# Altium footprint library USRP2_Clone.PcbLib: 91 footprints (part 5 of 6)
Each footprint in its own frame and in the unit in brackets; x right, y up, seen from the top. Pads: shape width x height; smd on the part's side, far side on the other; paste and mask are expansions set on the pad; w line width, h text height; cw(c..) or ccw(c..) is an arc to the next point about the centre after c.
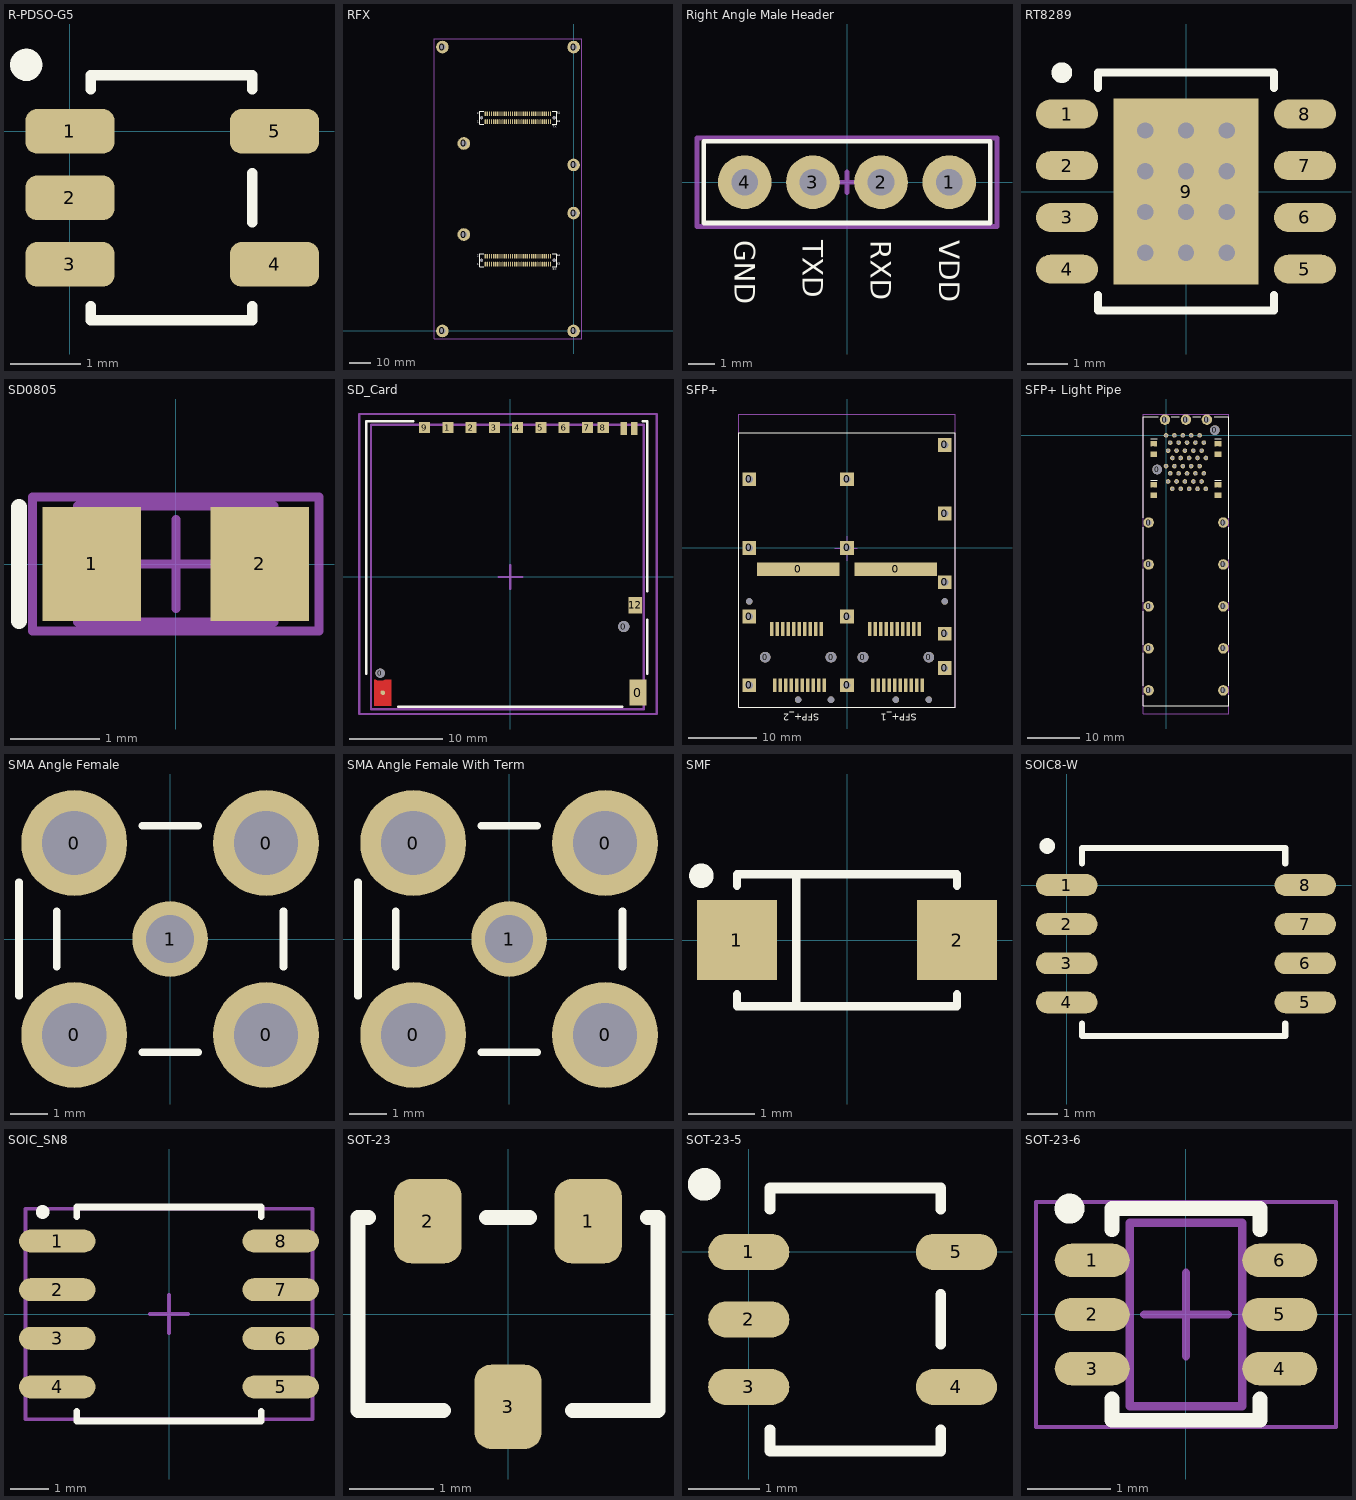
[diagram p4: the footprints below, top view; thin cyan lines are the x and y axes]

## R-PDSO-G5 [mm]
height 1.45
pads (5):
  rrect50% 1.27x0.635 smd: 1(0,0) 2(0,-0.95) 3(0,-1.9) 4(2.921,-1.9) 5(2.921,0)
Top Overlay:
  circle w0.254: c-0.625,0.95 r0.103
  lines w0.15: 0.3,-2.5 0.3,-2.7 2.6,-2.7 ; 0.3,0.6 0.3,0.8 2.6,0.8 2.6,0.6 ; 2.6,-2.5 2.6,-2.7 ; 2.6,-1.3 2.6,-0.6 ; 2.6,-2.7 2.6,-2.7
3D body "User Library-R-PDSO-G5.step": height 1.43, standoff -0.02, extent -0.075,-2.475 2.925,0.575

## RFX [mil]
height 393.7
pads (140):
  round 236.22 hole 118.11: 0(-2450,0) 0(-2450,5300) 0(-2050,1800) 0(-2050,3500) 0(0,0) 0(0,2200) 0(0,3100) 0(1,5299)
  round 59.06 hole 59.06 unplated: 0(-1717,1320) 0(-1717,3980) 0(-363,1320) 0(-363,3980)
  oval 24x92 smd: 1(-1650,3906) 2(-1650,4054) 3(-1611,3906) 4(-1611,4054) 5(-1572,3906) 6(-1572,4054) 7(-1532,3906) 8(-1532,4054) 9(-1493,3906) 10(-1493,4054) 11(-1454,3906) 12(-1454,4054) 13(-1414,3906) 14(-1414,4054) 15(-1375,3906) 16(-1375,4054) 17(-1336,3906) 18(-1336,4054) 19(-1296,3906) 20(-1296,4054) 21(-1257,3906) 22(-1257,4054) 23(-1217,3906) 24(-1217,4054) 25(-1178,3906) 26(-1178,4054) 27(-1139,3906) 28(-1139,4054) 29(-1099,3906) 30(-1099,4054) 31(-1060,3906) 32(-1060,4054) 33(-1021,3906) 34(-1021,4054) 35(-981,3906) 36(-981,4054) 37(-942,3906) 38(-942,4054) 39(-902,3906) 40(-902,4054) 41(-863,3906) 42(-863,4054) 43(-824,3906) 44(-824,4054) 45(-784,3906) 46(-784,4054) 47(-745,3906) 48(-745,4054) 49(-706,3906) 50(-706,4054) 51(-666,3906) 52(-666,4054) 53(-627,3906) 54(-627,4054) 55(-588,3906) 56(-588,4054) 57(-548,3906) 58(-548,4054) 59(-509,3906) 60(-509,4054) 61(-469,3906) 62(-469,4054) 63(-430,3906) 64(-430,4054) 65(-1650,1246) 66(-1650,1394) 67(-1611,1246) 68(-1611,1394) 69(-1572,1246) 70(-1572,1394) 71(-1532,1246) 72(-1532,1394) 73(-1493,1246) 74(-1493,1394) 75(-1454,1246) 76(-1454,1394) 77(-1414,1246) 78(-1414,1394) 79(-1375,1246) 80(-1375,1394) 81(-1336,1246) 82(-1336,1394) 83(-1296,1246) 84(-1296,1394) 85(-1257,1246) 86(-1257,1394) 87(-1217,1246) 88(-1217,1394) 89(-1178,1246) 90(-1178,1394) 91(-1139,1246) 92(-1139,1394) 93(-1099,1246) 94(-1099,1394) 95(-1060,1246) 96(-1060,1394) 97(-1021,1246) 98(-1021,1394) 99(-981,1246) 100(-981,1394) 101(-942,1246) 102(-942,1394) 103(-902,1246) 104(-902,1394) 105(-863,1246) 106(-863,1394) 107(-824,1246) 108(-824,1394) 109(-784,1246) 110(-784,1394) 111(-745,1246) 112(-745,1394) 113(-706,1246) 114(-706,1394) 115(-666,1246) 116(-666,1394) 117(-627,1246) 118(-627,1394) 119(-588,1246) 120(-588,1394) 121(-548,1246) 122(-548,1394) 123(-509,1246) 124(-509,1394) 125(-469,1246) 126(-469,1394) 127(-430,1246) 128(-430,1394)
Top Overlay:
  lines w7: -1677.63,1195 -1756.37,1195 -1756.37,1445 -1677.63,1445 ; -1677.63,3855 -1756.37,3855 -1756.37,4105 -1677.63,4105 ; -398.1,1195 -319.36,1195 -319.36,1445 -398.1,1445 ; -398.1,3855 -319.36,3855 -319.36,4105 -398.1,4105
  text "RX" at -390,1131 h40
  text "TX" at -390,3791 h40
  text "1" at -1799.36,1219.61 h40
  text "2" at -1799.36,1377.09 h40
  text "63" at -301.96,1228.46 h40
  text "64" at -301.96,1385.94 h40
  text "1" at -1800,3881 h40
  text "2" at -1800,4038.48 h40
  text "63" at -301.96,3888.46 h40
  text "64" at -301.96,4045.94 h40
Mechanical 13:
  lines w10: -2600,-150 150,-150 150,5450 -2600,5450 -2600,-150
3D body "714362164.stp": height 328.74, standoff -29.53, extent -1746.53,1199.92 -333.14,1440.08
3D body "714362164.stp": height 328.74, standoff -29.53, extent -1746.53,3859.92 -333.14,4100.08

## Right Angle Male Header [mm] "4-Way 2.54mm Right Angle Male Header"
height 3
pads (4):
  round 2 hole 1: 1(3.81,0) 2(1.27,0) 3(-1.27,0) 4(-3.81,0)
Top Overlay:
  lines w0.178: -5.334,-1.524 -5.334,1.524 5.334,1.524 5.334,-1.524 -5.334,-1.524
  text "GND" at -4.191,-2.159 h0.76
  text "TXD" at -1.651,-2.159 h0.76
  text "RXD" at 0.889,-2.159 h0.76
  text "VDD" at 3.429,-2.159 h0.76
Mechanical 15:
  lines w0.178: -0.508,0 0.508,0 ; 0,-0.381 0,0.381 ; -5.588,-1.651 -5.588,1.651 5.588,1.651 5.588,-1.651 -5.588,-1.651
3D body "User Library-Header_Male_RA_Low_4Pin.STEP": height 2.66, standoff -2.85, extent -5.08,-0.356 5.08,9.774

## RT8289 [mil]
height 39.37
pads (9):
  oval 60x28 smd: 1(-115,75) 2(-115,25) 3(-115,-25) 4(-115,-75) 5(115,-75) 6(115,-25) 7(115,25) 8(115,75)
  rect 140x180 all layers, no hole: 9(0,0)
via -39.37,59.06 diameter 27.56 hole 15.75
via 0,59.06 diameter 27.56 hole 15.75
via 39.37,59.06 diameter 27.56 hole 15.75
via -39.37,19.69 diameter 27.56 hole 15.75
via 0,19.69 diameter 27.56 hole 15.75
via 39.37,19.69 diameter 27.56 hole 15.75
via -39.37,-19.68 diameter 27.56 hole 15.75
via 0,-19.68 diameter 27.56 hole 15.75
via 39.37,-19.68 diameter 27.56 hole 15.75
via -39.37,-59.06 diameter 27.56 hole 15.75
via 0,-59.06 diameter 27.56 hole 15.75
via 39.37,-59.06 diameter 27.56 hole 15.75
Top Overlay:
  lines w7.87: -85,-100 -85,-115 85,-115 85,-100 ; -85,100 -85,115 85,115 85,100
  lines w10: -115.1,115.98 ccw(c-120,115) -115,115
Top Paste:
  rectangle: -62.99,3.94 -3.94,82.68
  rectangle: 3.94,3.94 62.99,82.68
  rectangle: -62.99,-82.68 -3.94,-3.94
  rectangle: 3.94,-82.68 62.99,-3.94
3D body "User Library-sop-8.step": height 62.99, standoff 0, extent -118.93,-98.82 118.94,98.82

## SD0805 [mm] "Schottky Barrier Rectifier Diode"
height 1.4
pads (2):
  rect 1.1x1.27 smd: 1(-0.94,0) 2(0.94,0)
Top Overlay:
  lines w0.178: -1.753,-0.635 -1.753,0.635
Mechanical 13:
  lines w0.1: -1.1,-0.65 1.1,-0.65 1.1,0.65 -1.1,0.65 -1.1,-0.65
Mechanical 15:
  lines w0.1: -0.5,0 0.5,0 ; 0,-0.5 0,0.5 ; -1.6,-0.75 1.6,-0.75 1.6,0.75 -1.6,0.75 -1.6,-0.75
3D body "User Library-D0805.step": height 0.76, standoff 0, extent -1.15,-0.675 1.15,0.675

## SD_Card [mm]
pads (16):
  round 1 hole 1 unplated: 0(-13.995,-10.338)
  round 0.5 smd: 0(-13.715,-12.438)
  round 1.2 hole 1.2 unplated: 0(12.192,-5.334)
  rect 1.8x2.8 smd: 0(13.712,-12.434)
  rect 1.2x1.2 smd: 1(-6.72,16.066) 2(-4.22,16.066) 3(-1.72,16.066) 4(0.78,16.066) 5(3.28,16.066) 6(5.78,16.066) 7(8.28,16.066) 8(9.98,16.066) 9(-9.22,16.066)
  rect 0.7x1.4 smd: 10(12.21,15.966) 11(13.31,15.966)
  rect 1.45x1.8 smd: 12(13.442,-3.034)
Top Layer:
  region: -14.61,-13.84 -14.61,-11.033 -14.463,-11.035 -14.355,-11.097 -14.119,-11.168 -13.871,-11.168 -13.635,-11.096 -13.527,-11.035 -12.811,-11.035 -12.808,-13.84
Top Overlay:
  lines w0.254: -15.494,-10.414 -15.494,16.764 -10.414,16.764 ; -12.065,-13.97 12.065,-13.97 ; 14.224,16.764 14.732,16.764 14.732,-1.524 ; 14.732,-10.414 14.732,-4.572
Mechanical 13:
  lines w0.254: -14.986,-14.224 -14.986,16.383 14.351,16.383 14.351,-14.224 -14.986,-14.224
Mechanical 15:
  lines w0.254: -1.27,0 1.27,0 ; 0,-1.27 0,1.27 ; -16.256,-14.732 -16.256,17.526 15.748,17.526 15.748,-14.732 -16.256,-14.732
3D body "User Library-sd card.step": height 2.35, standoff 0.25, extent -11.808,-19.755 12.192,12.245
3D body "c-1775059-1-d-3d.stp": height 2.83, standoff -0.58, extent -14.986,-14.233 14.324,16.367

## SFP+ [mm] "SFP+ 10Gbit Connector 1x2"
pads (65):
  rect 2x2 hole 1.05: 0(-14.25,-20) 0(-14.25,-10) 0(-14.25,0) 0(-14.25,10) 0(14.25,-5) 0(14.25,5) 0(14.25,15)
  round 0.95 hole 0.95 unplated: 0(-14.25,-7.8) 0(-7.13,-22.1) 0(-2.33,-22.1) 0(7.12,-22.1) 0(11.92,-22.1) 0(14.25,-7.8)
  round 1.55 hole 1.55 unplated: 0(-11.93,-15.9) 0(-2.33,-15.9) 0(2.33,-15.9) 0(11.93,-15.9)
  rect 12.05x2 smd: 0(-7.112,-3.1) 0(7.112,-3.1)
  rect 2x2 hole 0.95: 0(0,-20) 0(0,-10) 0(0,0) 0(0,10) 0(14.25,-17.5) 0(14.25,-12.5)
  rect 0.5x2 smd: 1(10.53,-11.8) 2(9.73,-11.8) 3(8.93,-11.8) 4(8.13,-11.8) 5(7.33,-11.8) 6(6.53,-11.8) 7(5.73,-11.8) 8(4.93,-11.8) 9(4.13,-11.8) 10(3.33,-11.8) 11(3.73,-20) 12(4.53,-20) 13(5.33,-20) 14(6.13,-20) 15(6.93,-20) 16(7.73,-20) 17(8.53,-20) 18(9.33,-20) 19(10.13,-20) 20(10.93,-20) 21(-3.73,-11.8) 22(-4.53,-11.8) 23(-5.33,-11.8) 24(-6.13,-11.8) 25(-6.93,-11.8) 26(-7.73,-11.8) 27(-8.53,-11.8) 28(-9.33,-11.8) 29(-10.13,-11.8) 30(-10.93,-11.8) 31(-10.53,-20) 32(-9.73,-20) 33(-8.93,-20) 34(-8.13,-20) 35(-7.33,-20) 36(-6.53,-20) 37(-5.73,-20) 38(-4.93,-20) 39(-4.13,-20) 40(-3.33,-20)
Top Overlay:
  lines w0.178: -15.748,-23.172 -15.748,16.764 15.748,16.764 15.748,-23.172 -15.748,-23.172
  text "SFP+_2" at -4.064,-24.188 h1.02
  text "SFP+_1" at 10.16,-24.188 h1.02
Mechanical 15:
  lines w0.178: -1.778,-0.058 1.524,-0.058 ; 0,-1.836 0,1.72 ; -15.748,-23.172 15.748,-23.172 15.748,19.5 -15.748,19.5 -15.748,-23.172
3D body "747540220.stp": height 10.67, standoff -2.91, extent -15.061,-22.539 15.088,26.487
3D body "744410010.stp": height 5.37, standoff -0.9, extent -12.612,-20.542 -1.612,-11.392
3D body "744410010.stp": height 5.37, standoff -0.9, extent 1.612,-20.542 12.612,-11.392

## SFP+ Light Pipe [mm] "CONN STACKED SFP+ 2X1 40POS"
height 26.25
pads (67):
  round 2 hole 1.05: 0(-3.325,-48.62) 0(-3.325,-40.62) 0(-3.325,-32.62) 0(-3.325,-24.62) 0(-3.325,-16.62) 0(-0.2,3.005) 0(3.8,3.005) 0(7.8,3.005) 0(10.925,-48.62) 0(10.925,-40.62) 0(10.925,-32.62) 0(10.925,-24.62) 0(10.925,-16.62)
  rrect50% 1.5x2.34 on Mech15: 0(-2.325,-10.45) 0(-2.325,-2.59) 0(9.925,-10.45) 0(9.925,-2.59)
  round 1.85 hole 1.85 unplated: 0(-1.7,-6.52) 0(9.3,0.98)
  rect 1.3x1.05 smd: INL_1(-2.325,-1.58) INL_2(-2.325,-3.6) INR_1(9.925,-1.58) INR_2(9.925,-3.6) OUTL_1(-2.325,-9.44) OUTL_2(-2.325,-11.46) OUTR_1(9.925,-9.44) OUTR_2(9.925,-11.46)
  round 0.88 hole 0.57: L1(7.2,-7.25) L2(6.4,-5.87) L3(5.6,-7.25) L4(4.8,-5.87) L5(4,-7.25) L6(3.2,-5.87) L7(2.4,-7.25) L8(1.6,-5.87) L9(0.8,-7.25) L10(0,-5.87) L11(0.4,-8.8) L12(1.2,-10.19) L13(2,-8.8) L14(2.8,-10.19) L15(3.6,-8.8) L16(4.4,-10.19) L17(5.2,-8.8) L18(6,-10.19) L19(6.8,-8.8) L20(7.6,-10.19) T1(0.4,-2.93) T2(1.2,-4.32) T3(2,-2.93) T4(2.8,-4.32) T5(3.6,-2.93) T6(4.4,-4.32) T7(5.2,-2.93) T8(6,-4.32) T9(6.8,-2.93) T10(7.6,-4.32) T11(7.2,-1.38) T12(6.4,0) T13(5.6,-1.38) T14(4.8,0) T15(4,-1.38) T16(3.2,0) T17(2.4,-1.38) T18(1.6,0) T19(0.8,-1.38) T20(0,0)
Top Overlay:
  lines w0.127: -2.96,-8.545 -1.69,-8.545 ; -2.96,-0.685 -1.69,-0.685 ; 9.29,-8.545 10.56,-8.545 ; 9.29,-0.685 10.56,-0.685
  lines w0.178: -4.318,-49.53 -4.318,-51.562 11.938,-51.562 11.938,-49.53 ; -4.318,-47.752 -4.318,-41.402 ; -4.318,-39.878 -4.318,-33.528 ; -4.318,-31.75 -4.318,-25.4 ; -4.318,-23.622 -4.318,-17.526 ; -4.318,-15.748 -4.318,3.556 -1.524,3.556 ; 1.016,3.556 2.54,3.556 ; 5.08,3.556 6.604,3.556 ; 9.144,3.556 11.938,3.556 11.938,-15.748 ; 11.938,-47.752 11.938,-41.402 ; 11.938,-39.878 11.938,-33.528 ; 11.938,-31.75 11.938,-25.4 ; 11.938,-23.622 11.938,-17.526
Mechanical 15:
  lines w0.178: -4.318,-53.12 11.938,-53.12 11.938,4.064 -4.318,4.064 -4.318,-53.12
3D body "760445001.stp": height 26.25, standoff -3.35, extent -4.096,-60.129 11.696,3.375
3D body "APHCM2012.STEP": height 0.4, standoff -0.01, extent -2.95,-3.59 -1.7,-1.59
3D body "APHCM2012.STEP": height 0.4, standoff -0.01, extent 9.3,-3.59 10.55,-1.59
3D body "APHCM2012.STEP": height 0.4, standoff -0.01, extent 9.3,-11.45 10.55,-9.45
3D body "APHCM2012.STEP": height 0.4, standoff -0.01, extent -2.95,-11.45 -1.7,-9.45

## SMA Angle Female [mm]
height 5
pads (5):
  round 2.8 hole 1.7: 0(-2.54,-2.54) 0(-2.54,2.54) 0(2.54,-2.54) 0(2.54,2.54)
  round 2 hole 1.27: 1(0,0)
Top Overlay:
  lines w0.2: -4,-1.5 -4,1.5 ; -3,-0.74 -3,0.74 ; -0.74,-3 0.74,-3 ; -0.74,3 0.74,3 ; 3,-0.74 3,0.74
3D body "User Library-SMA Angle Female.step": height 9.24, standoff -3.56, extent -11.7,-3.2 3.2,3.2

## SMA Angle Female With Term [mm]
height 5
pads (5):
  round 2.8 hole 1.7: 0(-2.54,-2.54) 0(-2.54,2.54) 0(2.54,-2.54) 0(2.54,2.54)
  round 2 hole 1.27: 1(0,0)
Top Overlay:
  lines w0.2: -4,-1.5 -4,1.5 ; -3,-0.74 -3,0.74 ; -0.74,-3 0.74,-3 ; -0.74,3 0.74,3 ; 3,-0.74 3,0.74
3D body "User Library-SMA Angle Female.step": height 9.24, standoff -3.56, extent -11.7,-3.2 3.2,3.2
3D body "User Library-SMA termination - M.step": height 10.72, standoff 1.48, extent -18.068,-4 -5.368,4

## SMF [mm]
height 2
pads (2):
  rect 1.2x1.2 smd: 1(-1.651,0) 2(1.651,0)
Top Overlay:
  circle w0.254: c-2.184,0.965 r0.057
  lines w0.127: -1.651,-0.813 -1.651,-0.991 1.651,-0.991 1.651,-0.813 ; -1.651,0.813 -1.651,0.991 1.651,0.991 1.651,0.813 ; -0.762,-0.991 -0.762,0.991
3D body "User Library-DO-219AB SMF.step": height 1.25, standoff 0, extent -1.95,-0.95 1.95,0.95

## SOIC8-W [mil]
height 85.04
pads (8):
  oval 78.74x28 smd: 1(0,0) 2(0,-50) 3(0,-100) 4(0,-150) 5(305,-150) 6(305,-100) 7(305,-50) 8(305,0)
Top Overlay:
  circle w10: c-25,50 r5
  lines w7.87: 19.68,-177.17 19.68,-192.91 279.53,-192.91 279.53,-177.17 ; 19.68,27.56 19.68,47.24 279.53,47.24 279.53,27.56
3D body "User Library-SOIC8_Wide_5mmx5mm.step": height 68.7, standoff -0.2, extent -6.95,-182.28 312.02,32.68

## SOIC_SN8 [mm]
pads (8):
  oval 2x0.6 smd: 1(-2.921,1.905) 2(-2.921,0.635) 3(-2.921,-0.635) 4(-2.921,-1.905) 5(2.921,-1.905) 6(2.921,-0.635) 7(2.921,0.635) 8(2.921,1.905)
Top Overlay:
  circle w0.178: c-3.302,2.667 r0.092
  lines w0.178: -2.413,-2.54 -2.413,-2.794 2.413,-2.794 2.413,-2.54 ; -2.413,2.54 -2.413,2.794 2.413,2.794 2.413,2.54
Mechanical 15:
  lines w0.1: -0.5,0 0.5,0 ; 0,-0.5 0,0.5 ; -3.75,-2.75 3.75,-2.75 3.75,2.75 -3.75,2.75 -3.75,-2.75
3D body "User Library-SOIC8_JEDEC_MS-012AA.step": height 1.75, standoff -0.01, extent -3.1,-2.5 3.1,2.5

## SOT-23 [mm]
height 1
pads (3):
  rrect50% 0.8x1 smd: 1(0.95,1.1) 2(-0.95,1.1) 3(0,-1.1)
Top Overlay:
  lines w0.178: -1.651,1.143 -1.778,1.143 -1.778,-1.143 -0.762,-1.143 ; -0.254,1.143 0.254,1.143 ; 0.762,-1.143 1.778,-1.143 1.778,1.143 1.651,1.143
3D body "SOT23-3_TO-236AB.step": height 1.09, standoff 0, extent -1.5,-1.25 1.5,1.25

## SOT-23-5 [mil]
height 57.09
pads (5):
  oval 45x20 smd: 1(0,0) 2(0,-37.4) 3(0,-74.8) 4(115,-74.8) 5(115,0)
Top Overlay:
  circle w10: c-24.61,37.4 r4.06
  lines w5.91: 11.81,-98.43 11.81,-110.24 106.3,-110.24 106.3,-98.43 ; 11.81,23.62 11.81,35.43 106.3,35.43 106.3,23.62 ; 106.3,-51.18 106.3,-23.62
3D body "User Library-SOT-23-5.STEP": height 55.69, standoff -1.8, extent -0.99,-96.45 117.13,21.66

## SOT-23-6 [mm] "SOT23, 6-Leads"
height 1.1
pads (6):
  oval 0.9x0.4 smd: 1(-1.125,0.65) 2(-1.125,0) 3(-1.125,-0.65) 4(1.125,-0.65) 5(1.125,0) 6(1.125,0.65)
Top Overlay:
  circle w0.178: c-1.397,1.27 r0.092
  lines w0.178: -0.889,-1.016 -0.889,-1.27 0.889,-1.27 0.889,-1.016 ; -0.889,1.016 -0.889,1.27 0.889,1.27 0.889,1.016
Mechanical 13:
  lines w0.1: -0.675,-1.1 0.675,-1.1 0.675,1.1 -0.675,1.1 -0.675,-1.1
Mechanical 15:
  lines w0.05: -1.8,-1.35 1.8,-1.35 1.8,1.35 -1.8,1.35 -1.8,-1.35
  lines w0.1: -0.5,0 0.5,0 ; 0,-0.5 0,0.5
3D body "User Library-TSSOP-6 (SOT-23-6 PITCH 0_65).STEP": height 1.1, standoff -0.01, extent -1.125,-1.125 1.125,1.125